# Altium footprint library 10A_Motor_Driver.PcbLib: 68 footprints (part 4 of 5)
Each footprint in its own frame and in the unit in brackets; x right, y up, seen from the top. Pads: shape width x height; smd on the part's side, far side on the other; paste and mask are expansions set on the pad; w line width, h text height; cw(c..) or ccw(c..) is an arc to the next point about the centre after c.
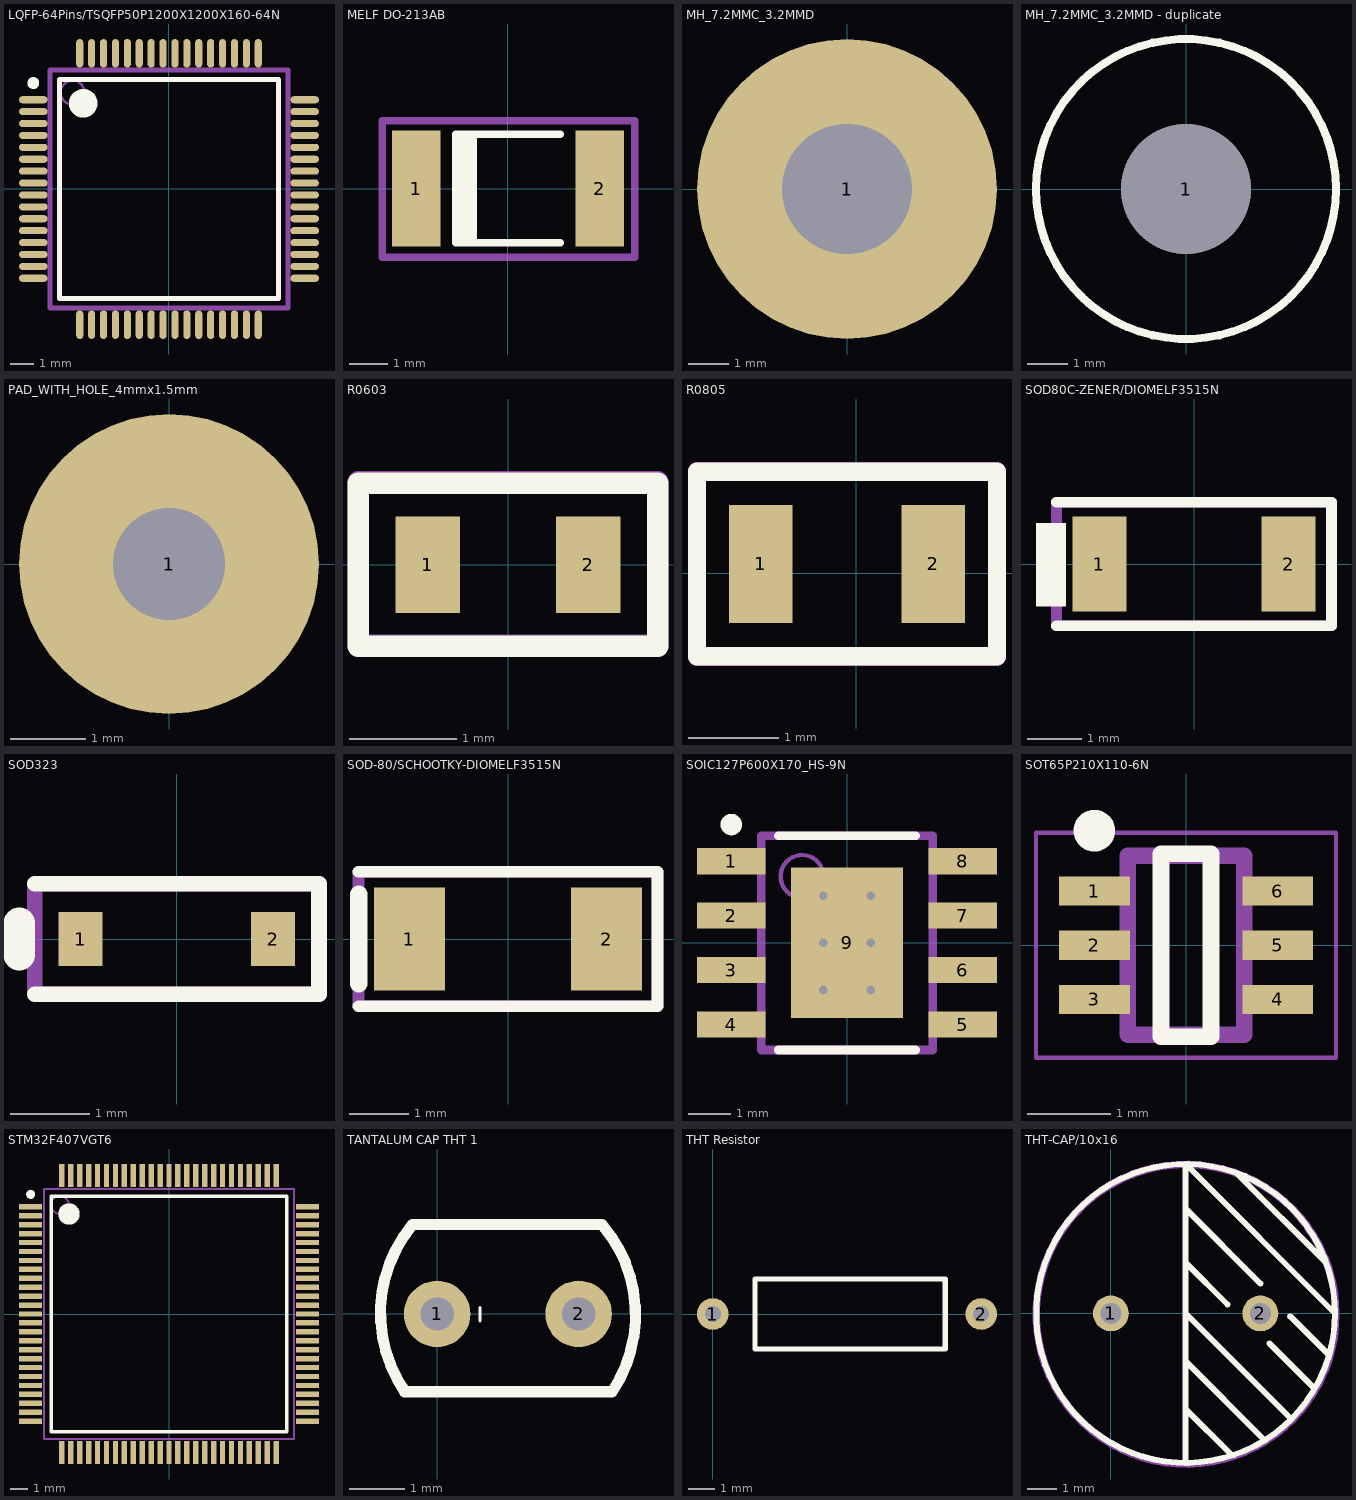
[diagram p3: the footprints below, top view; thin cyan lines are the x and y axes]

## LQFP-64Pins/TSQFP50P1200X1200X160-64N [mm] "TSQFP, 64-Leads, Body 10,00x10,00mm, Pitch 0,50mm, IPC Medium Density"
height 1.6
pads (64):
  oval 1.2x0.3 smd: 1(-5.7,3.75) 2(-5.7,3.25) 3(-5.7,2.75) 4(-5.7,2.25) 5(-5.7,1.75) 6(-5.7,1.25) 7(-5.7,0.75) 8(-5.7,0.25) 9(-5.7,-0.25) 10(-5.7,-0.75) 11(-5.7,-1.25) 12(-5.7,-1.75) 13(-5.7,-2.25) 14(-5.7,-2.75) 15(-5.7,-3.25) 16(-5.7,-3.75) 33(5.7,-3.75) 34(5.7,-3.25) 35(5.7,-2.75) 36(5.7,-2.25) 37(5.7,-1.75) 38(5.7,-1.25) 39(5.7,-0.75) 40(5.7,-0.25) 41(5.7,0.25) 42(5.7,0.75) 43(5.7,1.25) 44(5.7,1.75) 45(5.7,2.25) 46(5.7,2.75) 47(5.7,3.25) 48(5.7,3.75)
  oval 0.3x1.2 smd: 17(-3.75,-5.7) 18(-3.25,-5.7) 19(-2.75,-5.7) 20(-2.25,-5.7) 21(-1.75,-5.7) 22(-1.25,-5.7) 23(-0.75,-5.7) 24(-0.25,-5.7) 25(0.25,-5.7) 26(0.75,-5.7) 27(1.25,-5.7) 28(1.75,-5.7) 29(2.25,-5.7) 30(2.75,-5.7) 31(3.25,-5.7) 32(3.75,-5.7) 49(3.75,5.7) 50(3.25,5.7) 51(2.75,5.7) 52(2.25,5.7) 53(1.75,5.7) 54(1.25,5.7) 55(0.75,5.7) 56(0.25,5.7) 57(-0.25,5.7) 58(-0.75,5.7) 59(-1.25,5.7) 60(-1.75,5.7) 61(-2.25,5.7) 62(-2.75,5.7) 63(-3.25,5.7) 64(-3.75,5.7)
Top Overlay:
  circle w0.25: c-5.7,4.45 r0.125
  circle w0.6: c-3.6,3.6 r0.3
  lines w0.2: -4.6,-4.6 -4.6,4.6 4.6,4.6 4.6,-4.6 -4.6,-4.6
Top Assembly (Mech29):
  circle w0.1: c-4.05,4.05 r0.5
  lines w0.2: -5,-5 -5,5 5,5 5,-5 -5,-5
3D body "User Library-lqpf64.step": height 1.5, standoff 0.02, extent -6,-6 6,6

## MELF DO-213AB [mm] "MELF Diode, 2-Leads, Body 5,00x2,50mm, IPC Medium Density"
height 2.6
pads (2):
  rect 1.25x3 smd: 1(-2.375,0) 2(2.375,0)
Top Overlay:
  rectangle: -1.35,-1.4 -0.8,1.4
  lines w0.2: 1.35,-1.4 -1.35,-1.4 -1.35,1.4 1.35,1.4
Top Assembly (Mech29):
  lines w0.2: -3.251,-1.778 -3.251,1.753 3.277,1.753 3.277,-1.778 -3.251,-1.778
  text ".Designator" at -0.018,-0.081 h0.8
3D body "User Library-MELF DO213AB.step": height 2.6, standoff 0, extent -2.375,-1.305 2.425,1.295

## MH_7.2MMC_3.2MMD [mm]
pads (1):
  round 7.4 hole 3.2: 1(0,0)

## MH_7.2MMC_3.2MMD - duplicate [mm]
pads (1):
  round 3.2 hole 3.2 unplated: 1(0,0)
Top Overlay:
  circle w0.2: c0,0 r3.7

## PAD_WITH_HOLE_4mmx1.5mm [mm]
pads (1):
  round 4 hole 1.5: 1(0,0)

## R0603 [mm]
pads (2):
  rect 0.6x0.9 smd: 1(-0.75,0) 2(0.75,0)
Top Overlay:
  lines w0.2: -1.397,-0.762 -1.397,0.762 1.397,0.762 1.397,-0.762 -1.397,-0.762
Assembly Notes:
  lines w0.2: -1.397,-0.762 -1.397,0.762 1.397,0.762 1.397,-0.762 -1.397,-0.762
Top Assembly (Mech29):
  lines w0.2: -1.4,-0.75 1.4,-0.75 1.4,0.775 -1.4,0.775 -1.4,-0.75
  text ".Designator" at -1.05,-0.483 h0.8
3D body "R0603.step": height 0.78, standoff -0.01, extent -0.8,-0.44 0.8,0.4

## R0805 [mm]
pads (2):
  rect 0.7x1.3 smd: 1(-1.05,0.1) 2(0.85,0.1)
Top Overlay:
  lines w0.2: -1.751,-0.916 1.551,-0.916 1.551,1.116 -1.751,1.116 -1.751,-0.916
Top Assembly (Mech29):
  lines w0.2: -1.75,-0.925 -1.75,1.125 1.55,1.125 1.55,-0.925 -1.75,-0.925
  text ".Designator" at -1.325,-0.633 h0.8
3D body "RESC2012X70N EIA 0805.step": height 0.71, standoff 0.01, extent -1.1,-0.5 0.9,0.7

## SOD80C-ZENER/DIOMELF3515N [mm] "MELF Diode, 2-Leads, Body 3,50x1,53mm, IPC Medium Density"
height 1.6
pads (2):
  rect 1x1.75 smd: 1(-1.75,0) 2(1.75,0)
Top Overlay:
  rectangle: -2.921,-0.788 -2.371,0.762
  lines w0.2: -2.54,-1.143 2.54,-1.143 2.54,1.143 -2.54,1.143
Top Assembly (Mech29):
  lines w0.2: -2.54,-1.143 -2.54,1.143 2.54,1.143 2.54,-1.143 -2.54,-1.143
  text ".Designator" at -0.04,-0.073 h0.8
3D body: height 1.59, standoff 0, extent -1.85,-0.8 -1.55,0.797
3D body: height 1.58, standoff 0.04, extent -0.95,-0.771 -0.35,0.768
3D body: height 1.58, standoff 0.04, extent -1.55,-0.77 1.55,0.767
3D body: height 1.59, standoff 0, extent 1.55,-0.8 1.85,0.797

## SOD323 [mil]
pads (2):
  rect 22x27 smd: 1(-48,0) 2(48,0)
Top Overlay:
  lines w7.87: -70.87,-27.56 70.87,-27.56 70.87,27.56 -70.87,27.56
  lines w15.75: -78.74,-7.87 -78.74,7.87
Top Assembly (Mech29):
  lines w7.87: -70.87,-27.56 -70.87,27.56 70.87,27.56 70.87,-27.56 -70.87,-27.56
  text ".Designator" at -51.18,-17.06 h31.5
3D body "User Library-SOD2513X11.step": height 43.81, standoff 0.5, extent -53.14,-24.6 53.16,24.61

## SOD-80/SCHOOTKY-DIOMELF3515N [mm] "MELF Diode, 2-Leads, Body 3,50x1,50mm, IPC Medium Density"
height 1.6
pads (2):
  rect 1.2x1.75 smd: 1(-1.675,0) 2(1.675,0)
Top Overlay:
  lines w0.2: -2.54,-1.143 2.54,-1.143 2.54,1.143 -2.54,1.143
  lines w0.3: -2.54,-0.762 -2.54,0.762
Top Assembly (Mech29):
  lines w0.2: -2.54,-1.143 2.54,-1.143 2.54,1.143 -2.54,1.143 -2.54,-1.143
  text ".Designator" at -0.04,-0.073 h0.8
3D body "User Library-MiniMelf-2.step": height 1.6, standoff 0, extent -1.88,-0.8 1.82,0.8

## SOIC127P600X170_HS-9N [mm] "SOIC, 8-Leads, Body 4,90x3,90mm, Pitch 1,27mm, Thermal Pad 3,51x2,62mm, IPC Medium Density"
height 1.7
pads (9):
  rect 1.6x0.61 smd: 1(-2.7,1.905) 2(-2.7,0.635) 3(-2.7,-0.635) 4(-2.7,-1.905) 5(2.7,-1.905) 6(2.7,-0.635) 7(2.7,0.635) 8(2.7,1.905)
  rect 2.62x3.51 smd: 9(0,0)
via 0.55,-1.1 diameter 0.5 hole 0.2
via -0.55,-1.1 diameter 0.5 hole 0.2
via 0.55,0 diameter 0.5 hole 0.2
via -0.55,0 diameter 0.5 hole 0.2
via 0.55,1.1 diameter 0.5 hole 0.2
via -0.55,1.1 diameter 0.5 hole 0.2
Top Overlay:
  circle w0.25: c-2.7,2.76 r0.125
  lines w0.2: -1.6,-2.5 1.6,-2.5 ; -1.6,2.5 1.6,2.5
Top Assembly (Mech29):
  circle w0.1: c-1.05,1.55 r0.5
  lines w0.2: -2,-2.5 2,-2.5 2,2.5 -2,2.5 -2,-2.5
3D body "SOIC127P600X170_HS-9N.step": height 1.7, standoff 0, extent -3,-2.5 3,2.5

## SOT65P210X110-6N [mm] "SOT23, 6-Leads, Body 2,00x2,10mm, Pitch 0,65mm, IPC Medium Density"
height 1.1
pads (6):
  rect 0.85x0.35 smd: 1(-1.1,0.65) 2(-1.1,0) 3(-1.1,-0.65) 4(1.1,-0.65) 5(1.1,0) 6(1.1,0.65)
Top Overlay:
  circle w0.25: c-1.1,1.375 r0.125
  lines w0.2: -0.3,-1.1 -0.3,1.1 0.3,1.1 0.3,-1.1 -0.3,-1.1
Top 3D Body:
  lines w0.05: -1.8,-1.35 1.8,-1.35 1.8,1.35 -1.8,1.35 -1.8,-1.35
Top Assembly (Mech29):
  lines w0.2: -0.7,-1.075 0.7,-1.075 0.7,1.075 -0.7,1.075 -0.7,-1.075
3D body "SOT65P210X110-6N.step": height 1.1, standoff 0, extent -1.2,-1.075 1.2,1.075

## STM32F407VGT6 [mm] "TSQFP, 100-Leads, Body 14,00x14,00mm, Pitch 0,50mm, IPC Medium Density"
height 1.6
pads (100):
  rect 1.3x0.3 smd mask+0.05: 1(-7.75,6) 2(-7.75,5.5) 3(-7.75,5) 4(-7.75,4.5) 5(-7.75,4) 6(-7.75,3.5) 7(-7.75,3) 8(-7.75,2.5) 9(-7.75,2) 10(-7.75,1.5) 11(-7.75,1) 12(-7.75,0.5) 13(-7.75,0) 14(-7.75,-0.5) 15(-7.75,-1) 16(-7.75,-1.5) 17(-7.75,-2) 18(-7.75,-2.5) 19(-7.75,-3) 20(-7.75,-3.5) 21(-7.75,-4) 22(-7.75,-4.5) 23(-7.75,-5) 24(-7.75,-5.5) 25(-7.75,-6) 51(7.75,-6) 52(7.75,-5.5) 53(7.75,-5) 54(7.75,-4.5) 55(7.75,-4) 56(7.75,-3.5) 57(7.75,-3) 58(7.75,-2.5) 59(7.75,-2) 60(7.75,-1.5) 61(7.75,-1) 62(7.75,-0.5) 63(7.75,0) 64(7.75,0.5) 65(7.75,1) 66(7.75,1.5) 67(7.75,2) 68(7.75,2.5) 69(7.75,3) 70(7.75,3.5) 71(7.75,4) 72(7.75,4.5) 73(7.75,5) 74(7.75,5.5) 75(7.75,6)
  rect 0.3x1.3 smd mask+0.05: 26(-6,-7.75) 27(-5.5,-7.75) 28(-5,-7.75) 29(-4.5,-7.75) 30(-4,-7.75) 31(-3.5,-7.75) 32(-3,-7.75) 33(-2.5,-7.75) 34(-2,-7.75) 35(-1.5,-7.75) 36(-1,-7.75) 37(-0.5,-7.75) 38(0,-7.75) 39(0.5,-7.75) 40(1,-7.75) 41(1.5,-7.75) 42(2,-7.75) 43(2.5,-7.75) 44(3,-7.75) 45(3.5,-7.75) 46(4,-7.75) 47(4.5,-7.75) 48(5,-7.75) 49(5.5,-7.75) 50(6,-7.75) 76(6,7.75) 77(5.5,7.75) 78(5,7.75) 79(4.5,7.75) 80(4,7.75) 81(3.5,7.75) 82(3,7.75) 83(2.5,7.75) 84(2,7.75) 85(1.5,7.75) 86(1,7.75) 87(0.5,7.75) 88(0,7.75) 89(-0.5,7.75) 90(-1,7.75) 91(-1.5,7.75) 92(-2,7.75) 93(-2.5,7.75) 94(-3,7.75) 95(-3.5,7.75) 96(-4,7.75) 97(-4.5,7.75) 98(-5,7.75) 99(-5.5,7.75) 100(-6,7.75)
Top Overlay:
  circle w0.25: c-7.75,6.7 r0.125
  circle w0.6: c-5.6,5.6 r0.3
  lines w0.2: -6.6,-6.6 -6.6,6.6 6.6,6.6 6.6,-6.6 -6.6,-6.6
Top Assembly (Mech29):
  circle w0.1: c-6.1,6.1 r0.5
  lines w0.1: -7,-7 -7,7 7,7 7,-7 -7,-7
3D body "STM32F407VGT6.step": height 1.6, standoff 0, extent -8,-8 8,8

## TANTALUM CAP THT 1 [mm]
pads (2):
  round 1.2 hole 0.6: 1(0,0) 2(2.55,0)
Top Overlay:
  lines w0.05: 0.775,-0.125 0.775,0.117
  lines w0.2: -0.588,-1.403 3.154,-1.403 ccw(c1.074,-0.016) 2.972,1.612 -0.44,1.612 ; -0.588,-1.392 cw(c1.48,0.013) -0.451,1.601
3D body "t350a105m035at.stp": height 10.1, standoff -10.96, extent -0.975,-2.25 3.525,2.25

## THT Resistor [mm]
pads (2):
  round 1.2 hole 0.6: 1(0,0) 2(10.16,0)
Top Overlay:
  lines w0.2: 1.6,-1.325 8.8,-1.325 8.8,1.325 1.6,1.325 1.6,-1.325
3D body "User Library-R-Axial-0_25W-10_16.step": height 2.7, standoff -3.5, extent -0.3,-1.203 10.46,1.203

## THT-CAP/10x16 [mm]
pads (2):
  round 1.2 hole 0.7: 1(0,0) 2(5,0)
Top Overlay:
  circle w0.2: c2.5,0 r5
  lines w0.2: 2.5,-5 2.5,0 ; 2.5,-3.2 4,-4.7 ; 2.5,-1.6 5.1,-4.2 ; 2.5,1.7 3.9,0.3 ; 2.5,3.5 5,1 ; 4.2,4.7 7.2,1.7 ; 5.3,-1 6.8,-2.5 ; 6,-3.5 2.5,0 ; 6,-0.1 7.3,-1.4 ; 7.5,0 2.5,5 2.5,0
Top Assembly (Mech29):
  circle w0.254: c2.515,-0.025 r5.012
  text ".Designator" at 2.06,-0.874 h2
3D body "User Library-Cap-EL(10x16-5).x_t": height 16, standoff -3.3, extent -2.46,-5 7.542,5